# Altium footprint library esp32_spectrum.PcbLib: 15 footprints
Each footprint in its own frame and in the unit in brackets; x right, y up, seen from the top. Pads: shape width x height; smd on the part's side, far side on the other; paste and mask are expansions set on the pad; w line width, h text height; cw(c..) or ccw(c..) is an arc to the next point about the centre after c.
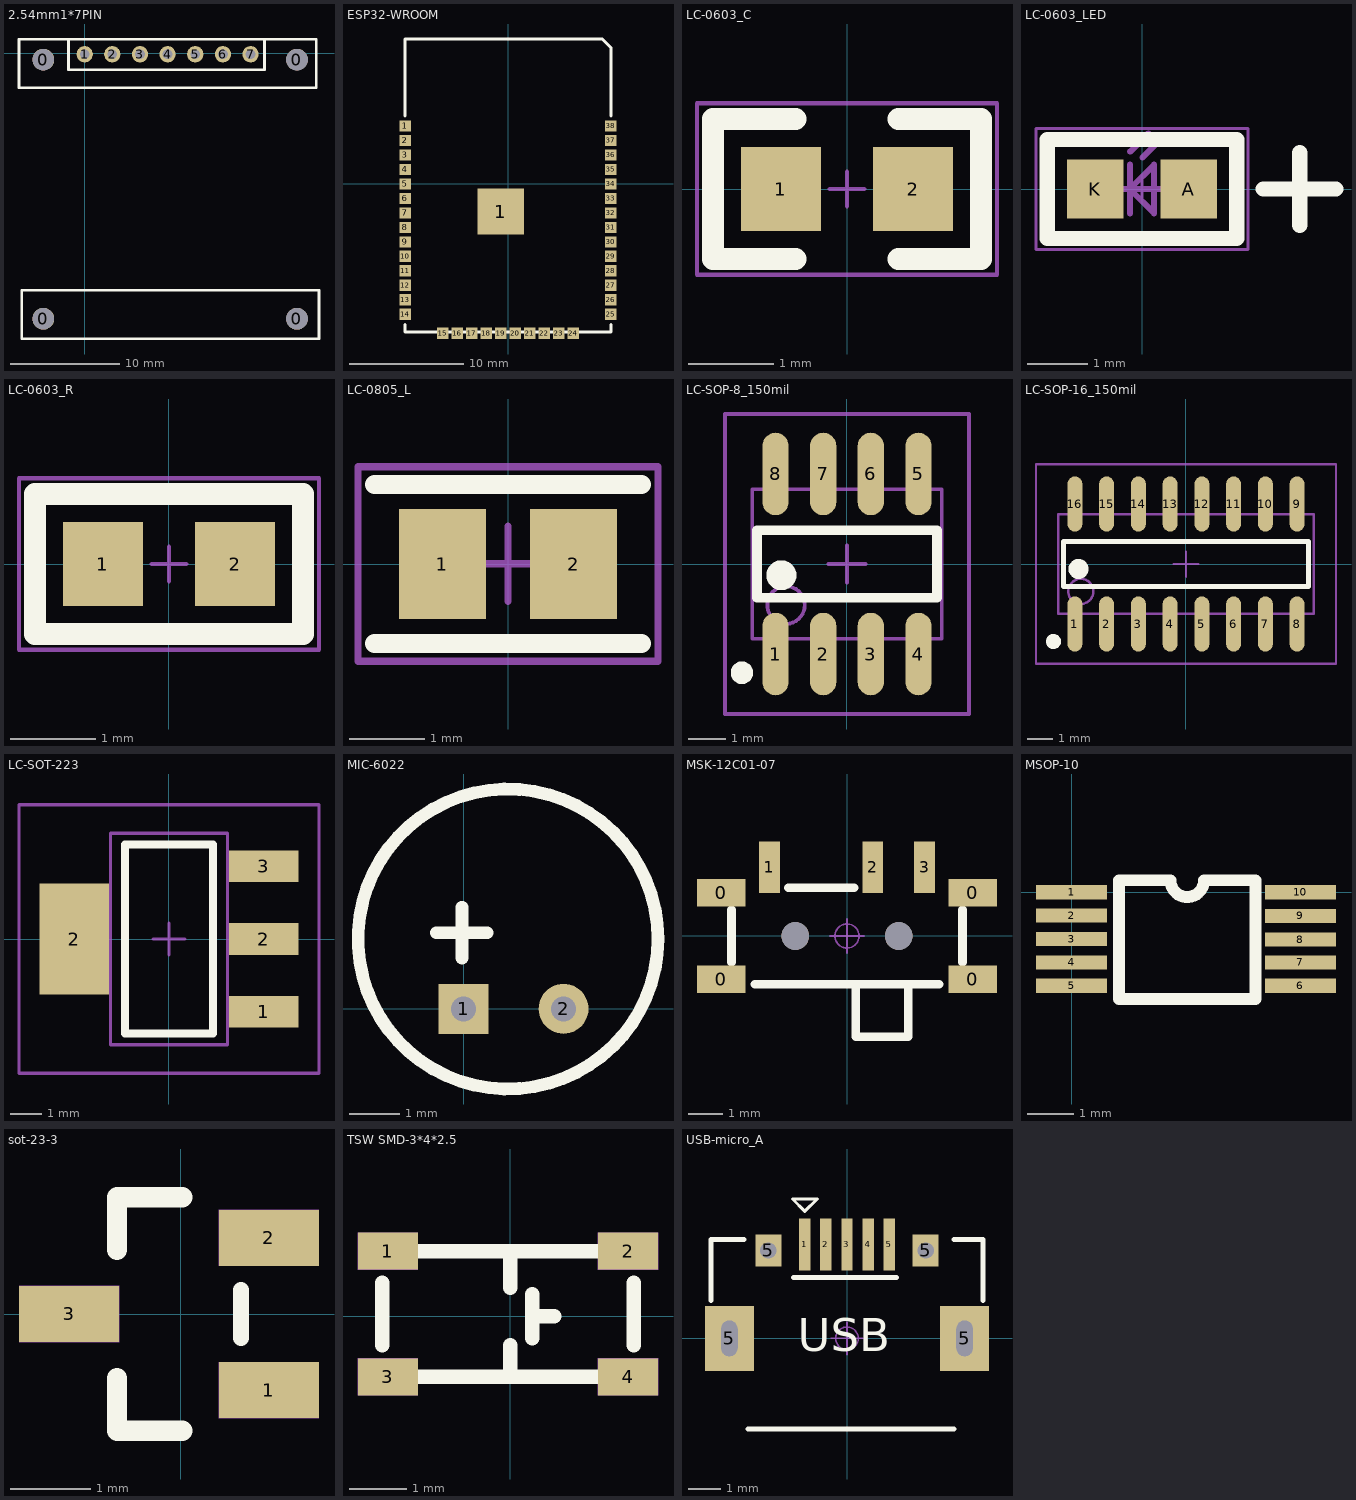
[diagram p0: the footprints below, top view; thin cyan lines are the x and y axes]

## 2.54mm1*7PIN [mm]
pads (11):
  round 2 hole 2: 0(-3.8,-24.4) 0(-3.8,-0.6) 0(19.5,-24.4) 0(19.5,-0.6)
  round 1.5 hole 0.9: 1(0,-0.1) 2(2.54,-0.1) 3(5.08,-0.1) 4(7.62,-0.1) 5(10.16,-0.1) 6(12.7,-0.1) 7(15.24,-0.1)
Top Overlay:
  lines w0.254: -1.48,1.27 -1.48,-1.53 16.52,-1.53 16.52,1.27 ; -1.028,-26.23 1.046,-26.23 ; 16.972,-26.23 14.699,-26.23 ; 1.046,-26.23 -5.78,-26.23 -5.78,-21.785 21.525,-21.785 21.525,-26.23 14.699,-26.23 ; 1.046,-26.23 14.699,-26.23 ; -6.032,-3.175 21.273,-3.175 21.273,1.27 -6.032,1.27 -6.032,-3.175
3D body "DISP-096OLED.STEP": height 3.92, standoff 0.09, extent -5.476,-23.792 21.224,-1.576

## ESP32-WROOM [mm]
pads (39):
  rect 1x1 smd: 1(-9.017,5.08) 2(-9.017,3.81) 3(-9.017,2.54) 4(-9.017,1.27) 5(-9.017,0) 6(-9.017,-1.27) 7(-9.017,-2.54) 8(-9.017,-3.81) 9(-9.017,-5.08) 10(-9.017,-6.35) 11(-9.017,-7.62) 12(-9.017,-8.89) 13(-9.017,-10.16) 14(-9.017,-11.43) 15(-5.715,-13.081) 16(-4.445,-13.081) 17(-3.175,-13.081) 18(-1.905,-13.081) 19(-0.635,-13.081) 20(0.635,-13.081) 21(1.905,-13.081) 22(3.175,-13.081) 23(4.445,-13.081) 24(5.715,-13.081) 25(9.017,-11.43) 26(9.017,-10.16) 27(9.017,-8.89) 28(9.017,-7.62) 29(9.017,-6.35) 30(9.017,-5.08) 31(9.017,-3.81) 32(9.017,-2.54) 33(9.017,-1.27) 34(9.017,0) 35(9.017,1.27) 36(9.017,2.54) 37(9.017,3.81) 38(9.017,5.08)
  rect 4.064x4.064 smd: 1(-0.635,-2.413)
Top Overlay:
  lines w0.254: -9.017,-12.319 -9.017,-12.954 9.017,-12.954 9.017,-12.319 ; -9.017,5.969 -9.017,12.7 8.255,12.7 9.017,11.938 9.017,5.969
3D body "User Library-ESP32-WROOM.STEP": height 2.91, standoff -0.01, extent -9,-13.004 9,12.496

## LC-0603_C [mm]
pads (2):
  rect 0.93x0.98 smd: 1(-0.77,0) 2(0.77,0)
Top Overlay:
  lines w0.254: -0.6,-0.817 -1.562,-0.817 -1.562,0.817 -0.6,0.817 ; 0.6,-0.817 1.562,-0.817 1.562,0.817 0.6,0.817
Mechanical 15:
  lines w0.05: -0.2,0 0.2,0 ; 0,-0.2 0,0.2 ; -1.75,-1 1.75,-1 1.75,1 -1.75,1 -1.75,-1
3D body "User Library-0603 SMD Capacitor.STEP": height 0.3, standoff 0, extent -0.8,-0.4 0.8,0.4

## LC-0603_LED [mm]
pads (2):
  rect 0.93x0.98 smd: A(0.77,0) K(-0.77,0)
Top Overlay:
  lines w0.254: 2,0 3.2,0 ; 2.6,-0.6 2.6,0.6 ; -1.562,-0.817 -1.562,0.817 1.562,0.817 1.562,-0.817 -1.562,-0.817
Mechanical 13:
  lines w0.1: -0.4,0 0.4,0 ; -0.2,-0.4 -0.2,0.4 ; -0.195,0.617 0.105,0.917 ; 0.005,0.517 0.305,0.817 ; -0.2,0 0.2,0.4 0.2,-0.4 -0.2,0
Mechanical 15:
  lines w0.05: -0.2,0 0.2,0 ; 0,-0.2 0,0.2 ; -1.75,-1 -1.75,1 1.75,1 1.75,-1 -1.75,-1
3D body "User Library-LED_0603_R.STEP": height 0.6, standoff 0, extent -0.8,-0.4 0.8,0.4

## LC-0603_R [mm]
pads (2):
  rect 0.93x0.98 smd: 1(-0.77,0) 2(0.77,0)
Top Overlay:
  lines w0.254: -1.562,-0.817 -1.562,0.817 1.562,0.817 1.562,-0.817 -1.562,-0.817
Mechanical 15:
  lines w0.05: -0.2,0 0.2,0 ; 0,-0.2 0,0.2 ; -1.75,-1 1.75,-1 1.75,1 -1.75,1 -1.75,-1
3D body "User Library-RES_1609-0603.STEP": height 0.56, standoff 0, extent -0.85,-0.4 0.85,0.4

## LC-0805_L [mm]
pads (2):
  rect 1.16x1.47 smd: 1(-0.875,0) 2(0.875,0)
Top Overlay:
  lines w0.254: -1.782,-1.062 1.782,-1.062 ; -1.782,1.062 1.782,1.062
Mechanical 15:
  lines w0.1: -0.5,0 0.5,0 ; 0,-0.5 0,0.5 ; -2,-1.3 2,-1.3 2,1.3 -2,1.3 -2,-1.3
3D body "L0805.STEP": height 0.6, standoff -0.02, extent -1.022,-0.637 1.028,0.638

## LC-SOP-8_150mil [mm]
pads (8):
  oval 0.7x2.2 smd: 1(-1.905,-2.4) 2(-0.635,-2.4) 3(0.635,-2.4) 4(1.905,-2.4) 5(1.905,2.4) 6(0.635,2.4) 7(-0.635,2.4) 8(-1.905,2.4)
Top Overlay:
  circle w0.4: c-1.75,-0.3 r0.2
  circle w0.3: c-2.8,-2.9 r0.15
  lines w0.254: -2.4,-0.9 -2.4,0.9 2.4,0.9 2.4,-0.9 -2.4,-0.9
Mechanical 13:
  circle w0.1: c-1.625,-1.095 r0.5
  lines w0.1: -2.525,-1.995 -2.525,1.995 2.525,1.995 2.525,-1.995 -2.525,-1.995
Mechanical 15:
  lines w0.1: -0.5,0 0.5,0 ; 0,-0.5 0,0.5 ; -3.25,-4 -3.25,4 3.25,4 3.25,-4 -3.25,-4
3D body "User Library-SOIC-8-150.STEP": height 1.75, standoff 0, extent -2.5,-3.1 2.5,3.1

## LC-SOP-16_150mil [mm]
pads (16):
  oval 0.6x2.2 smd: 1(-4.445,-2.4) 2(-3.175,-2.4) 3(-1.905,-2.4) 4(-0.635,-2.4) 5(0.635,-2.4) 6(1.905,-2.4) 7(3.175,-2.4) 8(4.445,-2.4) 9(4.445,2.4) 10(3.175,2.4) 11(1.905,2.4) 12(0.635,2.4) 13(-0.635,2.4) 14(-1.905,2.4) 15(-3.175,2.4) 16(-4.445,2.4)
Top Overlay:
  circle w0.4: c-4.3,-0.2 r0.2
  circle w0.3: c-5.3,-3.1 r0.15
  lines w0.2: -4.9,-0.9 4.9,-0.9 4.9,0.9 -4.9,0.9 -4.9,-0.9
Mechanical 13:
  circle w0.1: c-4.205,-1.095 r0.5
  lines w0.1: -5.105,-1.995 5.105,-1.995 5.105,1.995 -5.105,1.995 -5.105,-1.995
Mechanical 15:
  lines w0.1: -0.5,0 0.5,0 ; 0,-0.5 0,0.5 ; -6,-4 6,-4 6,4 -6,4 -6,-4
3D body "SOP-16.STEP": height 1.5, standoff -0.1, extent -5,-3.132 5,3.132

## LC-SOT-223 [mm]
pads (4):
  rect 2.2x1 smd: 1(3,-2.3) 2(3,0) 3(3,2.3)
  rect 2.2x3.5 smd: 2(-3,0)
Top Overlay:
  lines w0.254: -1.4,-3 -1.4,3 1.4,3 1.4,-3 -1.4,-3
Mechanical 13:
  lines w0.1: -1.85,-3.35 1.85,-3.35 1.85,3.35 -1.85,3.35 -1.85,-3.35
Mechanical 15:
  lines w0.1: -0.5,0 0.5,0 ; 0,-0.5 0,0.5 ; -4.75,-4.25 4.75,-4.25 4.75,4.25 -4.75,4.25 -4.75,-4.25
3D body "TO-223.STEP": height 1.64, standoff -0.04, extent -3.49,-3.242 3.49,3.243

## MIC-6022 [mm]
pads (2):
  rect 1x1 hole 0.5: 1(0,0)
  round 1 hole 0.5: 2(2,0)
Top Overlay:
  circle w0.254: c0.889,1.397 r3
  lines w0.254: -0.54,1.524 0.476,1.524 ; -0.032,1.016 -0.032,2.032
3D body: height 2.6, standoff -1.7, extent 1.397,1.397 1.397,1.397
3D body "MIC6022.STEP": height 2.6, standoff -1.7, extent -2.111,-1.73 3.889,4.27

## MSK-12C01-07 [mm] "6.7*2.8*1.5mm(����ߣ�"
pads (9):
  rect 1.4x0.8 smd: 0(-3.65,-1.25) 0(-3.65,1.25) 0(3.65,-1.25) 0(3.65,1.25)
  rect 0.6x1.5 smd: 1(-2.25,1.996) 2(0.75,1.996) 3(2.25,1.996)
  round 0.8 hole 0.8: " "(-1.5,0) " "(1.5,0)
Top Overlay:
  lines w0.254: -3.35,-0.762 -3.35,0.762 ; -2.667,-1.397 2.667,-1.397 ; -1.699,1.397 0.206,1.397 ; 0.254,-1.4 0.254,-2.921 1.778,-2.921 1.778,-1.4 ; 3.35,-0.762 3.35,0.762
Mechanical 15:
  circle w0.05: c0,0 r0.35
  lines w0.05: -0.5,0 0.5,0 ; 0,-0.5 0,0.5
3D body "MSK-12C01-07.STEP": height 1.5, standoff -0.5, extent -3.92,-2.9 3.92,2.4

## MSOP-10 [mil]
pads (10):
  rect 60x12 smd: 1(0,0) 2(0,-19.75) 3(0,-39.5) 4(0,-59.25) 5(0,-79) 6(193,-79) 7(193,-59.25) 8(193,-40) 9(193,-20) 10(193,0)
Top Overlay:
  lines w10: 82.5,10 40,10 40,-90 155,-90 155,-10 155,10 111.64,10 cw(c97.5,10) 83.36,10
3D body "MSOP-10.STEP": height 41, standoff -0.93, extent -10.08,-98.11 200,20

## sot-23-3 [mm]
pads (3):
  rect 1.25x0.7 smd: 1(1.103,-0.949) 2(1.103,0.951) 3(-1.397,0.001)
Top Overlay:
  lines w0.2: 0.753,-0.299 0.753,0.301
  lines w0.254: -0.797,-0.799 -0.797,-1.459 0.018,-1.459 ; 0.018,1.461 -0.797,1.461 ; -0.797,0.801 -0.797,1.461 ; -0.797,0.801 -0.797,1.461 ; -0.797,0.801 -0.797,1.461
Mechanical 5:
  region: -2.022,0.351 -0.772,0.351 -0.772,-0.349 -2.022,-0.349
  region: 0.478,1.301 1.728,1.301 1.728,0.601 0.478,0.601
  region: 0.478,-0.599 1.728,-0.599 1.728,-1.299 0.478,-1.299
3D body "SOT-23-3.STEP": height 1, standoff 0, extent -1.5,-1.5 1.5,1.5

## TSW SMD-3*4*2.5 [mm]
pads (4):
  rect 1.05x0.65 smd: 1(-2.143,1.14) 2(2.057,1.14) 3(-2.143,-1.06) 4(2.057,-1.06)
Top Overlay:
  lines w0.254: -2.243,-0.504 -2.243,0.584 ; -1.618,-1.06 1.532,-1.06 ; -1.618,1.14 1.532,1.14 ; 0,-0.976 0,-0.508 ; 0,0.503 0,1.097 ; 0.381,-0.381 0.381,0.381 ; 0.381,0 0.762,0 ; 2.157,-0.504 2.157,0.584
Mechanical 5:
  region: -2.668,1.465 -1.618,1.465 -1.618,0.815 -2.668,0.815
  region: 1.532,1.465 2.582,1.465 2.582,0.815 1.532,0.815
  region: -2.668,-0.735 -1.618,-0.735 -1.618,-1.385 -2.668,-1.385
  region: 1.532,-0.735 2.582,-0.735 2.582,-1.385 1.532,-1.385
Mechanical 15:
  lines w0.003: -0.06,0.478 -0.01,0.529
3D body "TSW_SMD_3x4x2.5.STEP": height 2.4, standoff -0.13, extent -2.5,-1.7 2.5,1.7

## USB-micro_A [mm] "micro��USB ��5.7*7.8*2.5mm"
pads (9):
  rect 0.35x1.6 smd: 1(-1.3,2.9) 2(-0.65,2.9) 3(0,2.9) 4(0.65,2.9) 5(1.3,2.9)
  rect 1.5x2 hole 0.5 slot 1.1 at 90 deg: 5(-3.625,0) 5(3.625,0)
  rect 0.8x1 hole 0.5: 5(-2.425,2.71) 5(2.425,2.71)
Top Overlay:
  lines w0.1: -1.681,4.297 -0.919,4.297 -1.3,3.916 -1.681,4.297
  lines w0.152: -4.191,1.168 -4.191,3.048 -3.175,3.048 ; -3.048,-2.794 3.302,-2.794 ; -1.65,1.875 1.525,1.875 ; 3.302,3.048 4.191,3.048 4.191,1.168
  text "USB" at -1.524,-0.402 h1.02
Mechanical 15:
  circle w0.05: c0,0 r0.35
  lines w0.05: -0.5,0 0.5,0 ; 0,-0.5 0,0.5
3D body "USB micro_A.STEP": height 2.8, standoff -0.95, extent -4.001,-2.71 4.001,2.89